# Altium footprint library ICs And Semiconductors THD.PcbLib: 350 footprints (part 10 of 22)
Each footprint in its own frame and in the unit in brackets; x right, y up, seen from the top. Pads: shape width x height; smd on the part's side, far side on the other; paste and mask are expansions set on the pad; w line width, h text height; cw(c..) or ccw(c..) is an arc to the next point about the centre after c.
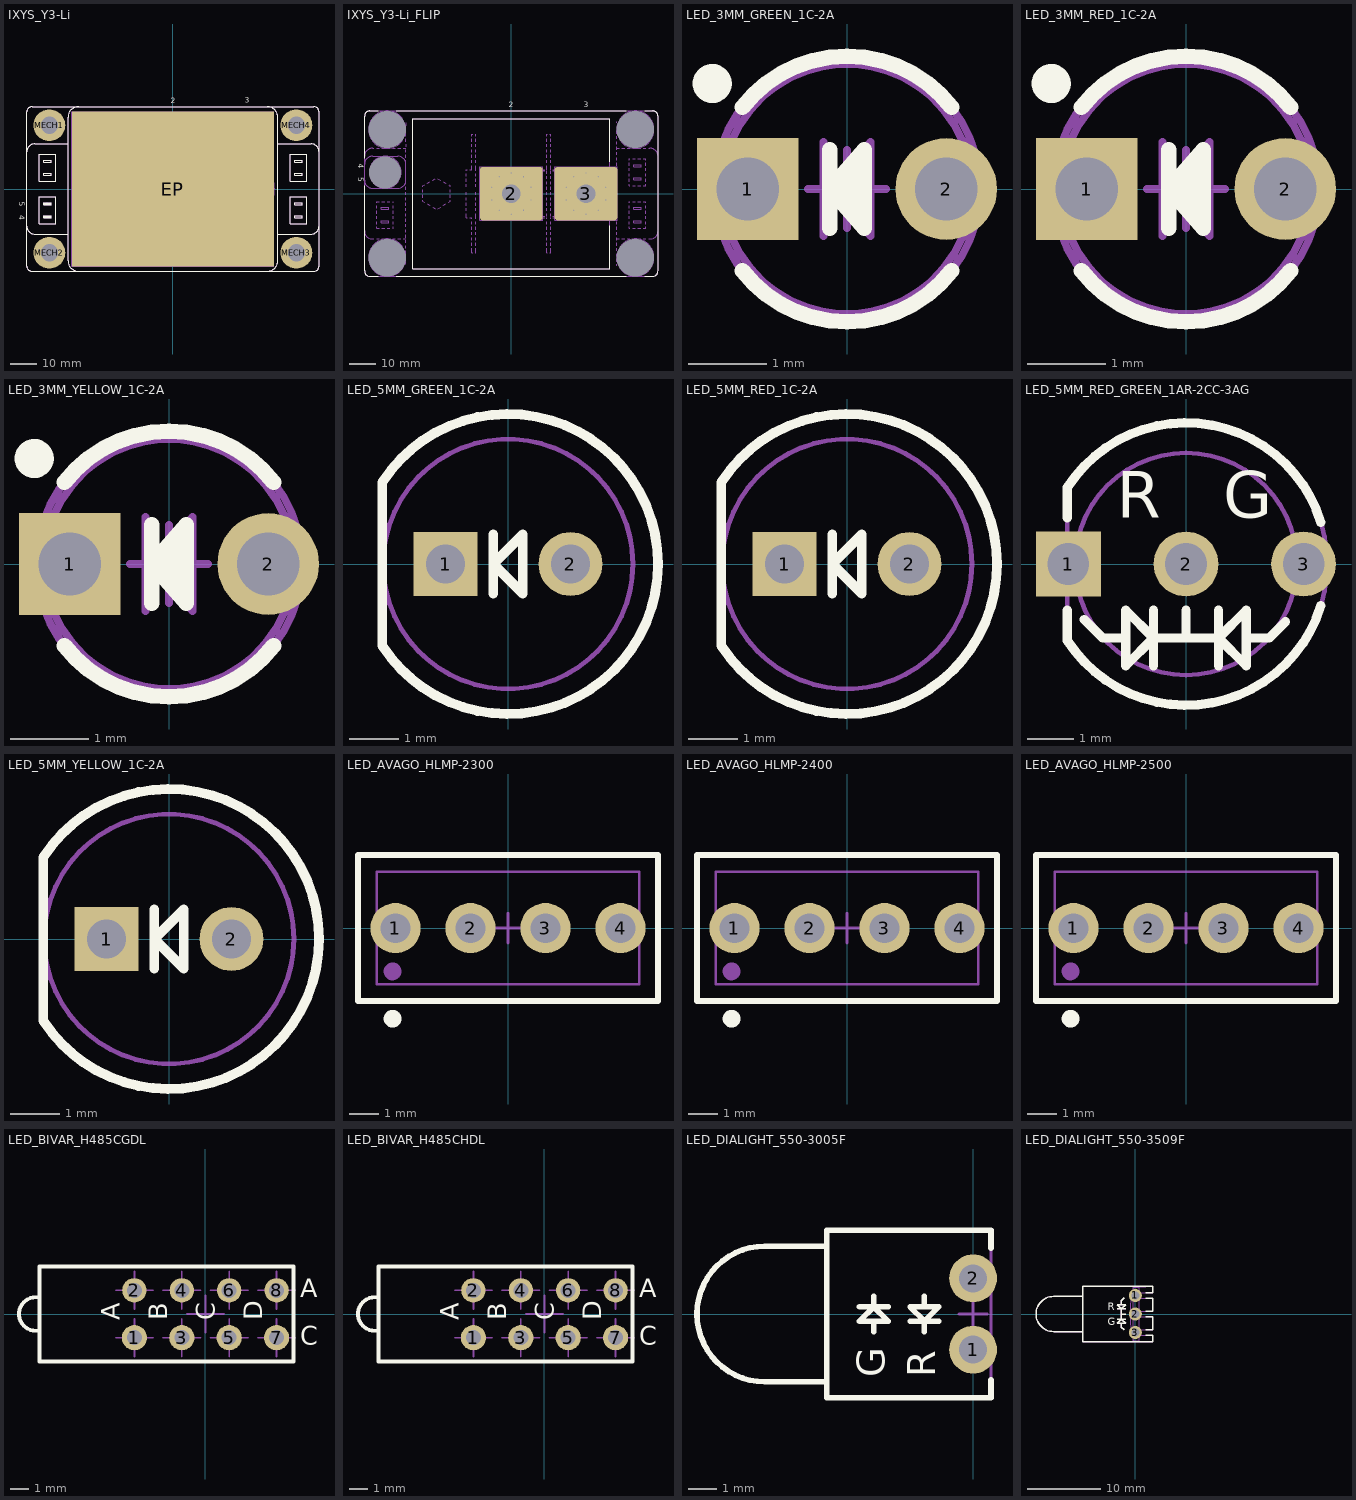
[diagram p9: the footprints below, top view; thin cyan lines are the x and y axes]

## IXYS_Y3-Li [mm] "IXYS Y3-Li Case, Body 110mm x 62mm, Screws on PCB Version"
height 31
pads (5):
  rect 76x58.2 smd: EP(0,0)
  round 12 hole 6.5: MECH1(-46.5,24) MECH2(-46.5,-24) MECH3(46.5,-24) MECH4(46.5,24)
Top Overlay:
  lines w0.2: -55,-14 ccw(c-52,-14) -52,-17 -39.5,-17 ; -55,14 cw(c-52,14) -52,17 -39.5,17 ; -48.65,-10.8 -45.85,-10.8 ; -48.65,-10.7 -45.85,-10.7 ; -48.65,-10.6 -45.85,-10.6 ; -48.65,-10.5 -45.85,-10.5 ; -48.65,-10.4 -45.85,-10.4 ; -48.65,-10.3 -45.85,-10.3 ; -48.65,-10.2 -45.85,-10.2 ; -48.65,-5.8 -45.85,-5.8 ; -48.65,-5.7 -45.85,-5.7 ; -48.65,-5.6 -45.85,-5.6 ; -48.65,-5.5 -45.85,-5.5 ; -48.65,-5.4 -45.85,-5.4 ; -48.65,-5.3 -45.85,-5.3 ; -48.65,-5.2 -45.85,-5.2 ; -35.5,-31 cw(c-35.5,-27) -39.5,-27 -39.5,27 cw(c-35.5,27) -35.5,31 ; 35.5,-31 ccw(c35.5,-27) 39.5,-27 39.5,27 ccw(c35.5,27) 35.5,31 ; 39.5,-17 52,-17 ccw(c52,-14) 55,-14 ; 39.5,17 52,17 cw(c52,14) 55,14 ; -55,-29 ccw(c-53,-29) -53,-31 53,-31 ccw(c53,-29) 55,-29 55,29 ccw(c53,29) 53,31 -53,31 ccw(c-53,29) -55,29 -55,-29 ; -50.35,-13 -50.35,-3 -44.15,-3 -44.15,-13 -50.35,-13 ; -50.35,3 -44.15,3 -44.15,13 -50.35,13 -50.35,3 ; -48.65,-10.9 -48.65,-10.1 -45.85,-10.1 -45.85,-10.9 -48.65,-10.9 ; -48.65,-5.9 -48.65,-5.1 -45.85,-5.1 -45.85,-5.9 -48.65,-5.9 ; -48.65,5.1 -48.65,5.9 -45.85,5.9 -45.85,5.1 -48.65,5.1 ; -48.65,10.1 -48.65,10.9 -45.85,10.9 -45.85,10.1 -48.65,10.1 ; 44.15,-13 50.35,-13 50.35,-3 44.15,-3 44.15,-13 ; 44.15,3 50.35,3 50.35,13 44.15,13 44.15,3 ; 45.85,-10.9 48.65,-10.9 48.65,-10.1 45.85,-10.1 45.85,-10.9 ; 45.85,-5.9 48.65,-5.9 48.65,-5.1 45.85,-5.1 45.85,-5.9 ; 45.85,5.1 48.65,5.1 48.65,5.9 45.85,5.9 45.85,5.1 ; 45.85,10.1 48.65,10.1 48.65,10.9 45.85,10.9 45.85,10.1
  text "4" at -57.95,-9.846 h2
  text "3" at 27.096,32.45 h2
  text "2" at -0.904,32.35 h2
  text "5" at -57.95,-4.846 h2
Notvisible:
  lines w0.1: -47.75,-10.5 -47.25,-10.5 ; -47.75,-5.5 -47.25,-5.5 ; -47.25,-11 -47.25,-10.5 ; -47.25,-10 -47.25,-10.5 ; -47.25,-6 -47.25,-5.5 ; -47.25,-5 -47.25,-5.5 ; -47,-24 -46.5,-24 ; -47,24 -46.5,24 ; -46.75,-10.5 -47.25,-10.5 ; -46.75,-5.5 -47.25,-5.5 ; -46.5,-24.5 -46.5,-24 ; -46.5,-23.5 -46.5,-24 ; -46.5,23.5 -46.5,24 ; -46.5,24.5 -46.5,24 ; -46,-24 -46.5,-24 ; -46,24 -46.5,24 ; -0.5,0 0,0 ; 0,-0.5 0,0 ; 0,0.5 0,0 ; 0.5,0 0,0 ; 27.5,0 28,0 ; 28,-0.5 28,0 ; 28,0.5 28,0 ; 28.5,0 28,0 ; 46,-24 46.5,-24 ; 46,24 46.5,24 ; 46.5,-24.5 46.5,-24 ; 46.5,-23.5 46.5,-24 ; 46.5,23.5 46.5,24 ; 46.5,24.5 46.5,24 ; 47,-24 46.5,-24 ; 47,24 46.5,24 ; -38,-29.1 -38,29.1 38,29.1 38,-29.1 -38,-29.1
Mechanical 14:
  circle w0.1: c-28,0 r3
  circle w0.1: c46.5,-24 r3.25
  circle w0.1: c46.5,24 r3.25
  circle w0.1: c-46.5,24 r3.25
  circle w0.1: c-46.5,-24 r3.288
  lines w0.1: -55,-14 ccw(c-52,-14) -52,-17 -39.5,-17 ; -55,14 cw(c-52,14) -52,17 -39.5,17 ; -48.65,-10.8 -45.85,-10.8 ; -48.65,-10.7 -45.85,-10.7 ; -48.65,-10.6 -45.85,-10.6 ; -48.65,-10.5 -45.85,-10.5 ; -48.65,-10.4 -45.85,-10.4 ; -48.65,-10.3 -45.85,-10.3 ; -48.65,-10.2 -45.85,-10.2 ; -48.65,-5.8 -45.85,-5.8 ; -48.65,-5.7 -45.85,-5.7 ; -48.65,-5.6 -45.85,-5.6 ; -48.65,-5.5 -45.85,-5.5 ; -48.65,-5.4 -45.85,-5.4 ; -48.65,-5.3 -45.85,-5.3 ; -48.65,-5.2 -45.85,-5.2 ; -35.5,-31 cw(c-35.5,-27) -39.5,-27 -39.5,27 cw(c-35.5,27) -35.5,31 ; 11.1,-8.5 11.1,-9 13.25,-9 13.25,-22.25 14.75,-22.25 14.75,-9 16.9,-9 16.9,-8.5 ; 11.1,8.5 11.1,9 13.25,9 13.25,22.25 14.75,22.25 14.75,9 16.9,9 16.9,8.5 ; 35.5,-31 ccw(c35.5,-27) 39.5,-27 39.5,27 ccw(c35.5,27) 35.5,31 ; 39.5,-17 52,-17 ccw(c52,-14) 55,-14 ; 39.5,17 52,17 cw(c52,14) 55,14 ; -55,-29 ccw(c-53,-29) -53,-31 53,-31 ccw(c53,-29) 55,-29 55,29 ccw(c53,29) 53,31 -53,31 ccw(c-53,29) -55,29 -55,-29 ; -50.35,-13 -50.35,-3 -44.15,-3 -44.15,-13 -50.35,-13 ; -50.35,3 -44.15,3 -44.15,13 -50.35,13 -50.35,3 ; -48.65,-10.9 -48.65,-10.1 -45.85,-10.1 -45.85,-10.9 -48.65,-10.9 ; -48.65,-5.9 -48.65,-5.1 -45.85,-5.1 -45.85,-5.9 -48.65,-5.9 ; -48.65,5.1 -48.65,5.9 -45.85,5.9 -45.85,5.1 -48.65,5.1 ; -48.65,10.1 -48.65,10.9 -45.85,10.9 -45.85,10.1 -48.65,10.1 ; -33.1,-2.944 -33.1,2.944 -28,5.889 -22.9,2.944 -22.9,-2.944 -28,-5.889 -33.1,-2.944 ; -16.9,-9 -14.75,-9 -14.75,-22.25 -13.25,-22.25 -13.25,22.25 -14.75,22.25 -14.75,9 -16.9,9 -16.9,-9 ; -8.25,-8.5 cw(c8.813,0) -8.25,8.5 13.25,8.5 13.25,-8.5 -8.25,-8.5 ; -0.5,-3.25 cw(c-0.5,0) -0.5,3.25 0.5,3.25 cw(c0.5,0) 0.5,-3.25 -0.5,-3.25 ; 14.75,-8.5 14.75,8.5 36.25,8.5 cw(c19.188,0) 36.25,-8.5 14.75,-8.5 ; 27.5,-3.25 cw(c27.5,0) 27.5,3.25 28.5,3.25 cw(c28.5,0) 28.5,-3.25 27.5,-3.25 ; 44.15,-13 50.35,-13 50.35,-3 44.15,-3 44.15,-13 ; 44.15,3 50.35,3 50.35,13 44.15,13 44.15,3 ; 45.85,-10.9 48.65,-10.9 48.65,-10.1 45.85,-10.1 45.85,-10.9 ; 45.85,-5.9 48.65,-5.9 48.65,-5.1 45.85,-5.1 45.85,-5.9 ; 45.85,5.1 48.65,5.1 48.65,5.9 45.85,5.9 45.85,5.1 ; 45.85,10.1 48.65,10.1 48.65,10.9 45.85,10.9 45.85,10.1
  text "4" at -57.95,-9.846 h2
  text "5" at -57.95,-4.846 h2
3D body "IXYS_Y3-Li.stp": height 31, standoff 0, extent -55,-31 55,31

## IXYS_Y3-Li_FLIP [mm] "IXYS Y3-Li Case, Body 110mm x 62mm"
height 31
pads (7):
  rrect10% 23.5x20 hole 7: 2(0,0) 3(28,0)
  round 1 hole 14 unplated mask+6.5: MECH1(-46.5,24) MECH2(-46.5,-24) MECH3(46.5,-24) MECH4(46.5,24)
  round 1 hole 12 unplated mask+5.5: MECH5(-47.25,8)
via 4.555,6.27 diameter 1 hole 0.5
via 7.371,2.395 diameter 1 hole 0.5
via 7.371,-2.395 diameter 1 hole 0.5
via 4.555,-6.27 diameter 1 hole 0.5
via -4.555,-6.27 diameter 1 hole 0.5
via -7.371,-2.395 diameter 1 hole 0.5
via -7.371,2.395 diameter 1 hole 0.5
via -4.555,6.27 diameter 1 hole 0.5
via 0,7.75 diameter 1 hole 0.5
via 0,-7.75 diameter 1 hole 0.5
via 23.445,6.27 diameter 1 hole 0.5
via 28,7.75 diameter 1 hole 0.5
via 32.555,6.27 diameter 1 hole 0.5
via 35.371,2.395 diameter 1 hole 0.5
via 35.371,-2.395 diameter 1 hole 0.5
via 32.555,-6.27 diameter 1 hole 0.5
via 28,-7.75 diameter 1 hole 0.5
via 23.445,-6.27 diameter 1 hole 0.5
via 20.629,-2.395 diameter 1 hole 0.5
via 20.629,2.395 diameter 1 hole 0.5
Top Overlay:
  lines w0.2: -55,3 -55,-29 ccw(c-53,-29) -53,-31 -49.941,-31 ; -55,13.332 -55,29 cw(c-53,29) -53,31 -49.941,31 ; -43.059,-31 43.059,-31 ; -43.059,31 43.059,31 ; 37,-12 37,-28.1 -37,-28.1 -37,28.1 37,28.1 37,12 ; 49.941,-31 53,-31 ccw(c53,-29) 55,-29 55,29 ccw(c53,29) 53,31 49.941,31
  text "2" at -0.904,32.35 h2
  text "3" at 27.096,32.45 h2
  text "4" at -57.45,11.154 h2
  text "5" at -57.45,6.154 h2
Notvisible:
  circle w0.1: c-46.5,24 r7
  circle w0.1: c-47.25,8 r6
  circle w0.1: c46.5,-24 r7
  circle w0.1: c-46.5,-24 r7
  circle w0.1: c46.5,24 r7
  circle w0.1: c28,0 r7.75
  circle w0.1: c0,0 r7.75
  circle w0.1: c28,0 r3.5
  circle w0.1: c0,0 r3.5
  lines w0.1: -47.75,5.5 -47.25,5.5 ; -47.75,8 -47.25,8 ; -47.75,10.5 -47.25,10.5 ; -47.25,5 -47.25,5.5 ; -47.25,6 -47.25,5.5 ; -47.25,7.5 -47.25,8 ; -47.25,8.5 -47.25,8 ; -47.25,10 -47.25,10.5 ; -47.25,11 -47.25,10.5 ; -47,-24 -46.5,-24 ; -47,24 -46.5,24 ; -46.75,5.5 -47.25,5.5 ; -46.75,8 -47.25,8 ; -46.75,10.5 -47.25,10.5 ; -46.5,-24.5 -46.5,-24 ; -46.5,-23.5 -46.5,-24 ; -46.5,23.5 -46.5,24 ; -46.5,24.5 -46.5,24 ; -46,-24 -46.5,-24 ; -46,24 -46.5,24 ; -39.5,4.5 -39.5,11 ccw(c-42.5,11) -42.5,14 -52,14 ccw(c-52,11) -55,11 -55,5 ccw(c-52,5) -52,2 -42.5,2 ccw(c-42.5,5) -39.5,5 ; -7.371,-2.395 0,0 ; -7.371,2.395 0,0 ; -4.555,-6.27 0,0 ; -4.555,6.27 0,0 ; -0.354,-0.354 0,0 ; -0.354,0.354 0,0 ; 0,-7.75 0,0 ; 0,7.75 0,0 ; 0.354,-0.354 0,0 ; 0.354,0.354 0,0 ; 4.555,-6.27 0,0 ; 4.555,6.27 0,0 ; 7.371,-2.395 0,0 ; 7.371,2.395 0,0 ; 20.629,-2.395 28,0 ; 20.629,2.395 28,0 ; 23.445,-6.27 28,0 ; 23.445,6.27 28,0 ; 27.646,-0.354 28,0 ; 27.646,0.354 28,0 ; 28,-7.75 28,0 ; 28,7.75 28,0 ; 28.354,-0.354 28,0 ; 28.354,0.354 28,0 ; 32.555,-6.27 28,0 ; 32.555,6.27 28,0 ; 35.371,-2.395 28,0 ; 35.371,2.395 28,0 ; 46,-24 46.5,-24 ; 46,24 46.5,24 ; 46.5,-24.5 46.5,-24 ; 46.5,-23.5 46.5,-24 ; 46.5,23.5 46.5,24 ; 46.5,24.5 46.5,24 ; 47,-24 46.5,-24 ; 47,24 46.5,24 ; -11.75,-10 11.75,-10 11.75,10 -11.75,10 -11.75,-10 ; 16.25,-10 16.25,10 39.75,10 39.75,-10 16.25,-10
Mechanical 14:
  drawing of 385 lines, arcs and shapes, not listed
  text "4" at -57.45,11.154 h2
  text "5" at -57.45,6.154 h2
3D body "IXYS_Y3-Li_FLIP.stp": height 31, standoff 0, extent -55,-31 55,31

## LED_3MM_GREEN_1C-2A [mm] "LED, Green, Body Dia. 3.43 mm, Pin spacing 2.54mm"
height 6.35
pads (2):
  rect 1.3x1.3 hole 0.8: 1(-1.27,0)
  round 1.3 hole 0.8: 2(1.27,0)
Top Overlay:
  circle w0.25: c-1.725,1.35 r0.125
  lines w0.2: -1.339,-1.048 ccw(c0,0) 1.339,-1.048 ; -1.339,1.048 cw(c0,0) 1.339,1.048 ; -0.22,-0.5 -0.22,0.5 ; 0.22,-0.4 -0.22,0 ; 0.22,-0.3 -0.22,0 ; 0.22,-0.2 -0.22,0 ; 0.22,-0.1 -0.22,0 ; 0.22,0 -0.22,0 ; 0.22,0.1 -0.22,0 ; 0.22,0.2 -0.22,0 ; 0.22,0.3 -0.22,0 ; 0.22,0.4 -0.22,0 ; -0.22,0 0.22,0.5 0.22,-0.5 -0.22,0
Notvisible:
  lines w0.1: -1.77,0 -1.27,0 ; -1.27,-0.5 -1.27,0 ; -1.27,0.5 -1.27,0 ; -0.77,0 -1.27,0 ; -0.5,0 0,0 ; 0,-0.5 0,0 ; 0,0.5 0,0 ; 0.5,0 0,0 ; 0.77,0 1.27,0 ; 1.27,-0.5 1.27,0 ; 1.27,0.5 1.27,0 ; 1.77,0 1.27,0
Mechanical 14:
  circle w0.1: c0,0 r1.7
  circle w0.1: c0,0 r1.6
  lines w0.1: -0.3,-0.6 -0.3,0.6 ; 0.3,0 -0.3,0 ; -0.3,0 0.3,0.6 0.3,-0.6 -0.3,0
3D body "LED_3MM_GREEN_v.stp": height 9.85, standoff -3.5, extent -1.715,-1.715 1.715,1.715

## LED_3MM_RED_1C-2A [mm] "LED, Red, Body Dia. 3.43 mm, Pin spacing 2.54mm"
height 6.35
pads (2):
  rect 1.3x1.3 hole 0.8: 1(-1.27,0)
  round 1.3 hole 0.8: 2(1.27,0)
Top Overlay:
  circle w0.25: c-1.725,1.35 r0.125
  lines w0.2: -1.339,-1.048 ccw(c0,0) 1.339,-1.048 ; -1.339,1.048 cw(c0,0) 1.339,1.048 ; -0.22,-0.5 -0.22,0.5 ; 0.22,-0.4 -0.22,0 ; 0.22,-0.3 -0.22,0 ; 0.22,-0.2 -0.22,0 ; 0.22,-0.1 -0.22,0 ; 0.22,0 -0.22,0 ; 0.22,0.1 -0.22,0 ; 0.22,0.2 -0.22,0 ; 0.22,0.3 -0.22,0 ; 0.22,0.4 -0.22,0 ; -0.22,0 0.22,0.5 0.22,-0.5 -0.22,0
Notvisible:
  lines w0.1: -1.77,0 -1.27,0 ; -1.27,-0.5 -1.27,0 ; -1.27,0.5 -1.27,0 ; -0.77,0 -1.27,0 ; -0.5,0 0,0 ; 0,-0.5 0,0 ; 0,0.5 0,0 ; 0.5,0 0,0 ; 0.77,0 1.27,0 ; 1.27,-0.5 1.27,0 ; 1.27,0.5 1.27,0 ; 1.77,0 1.27,0
Mechanical 14:
  circle w0.1: c0,0 r1.7
  circle w0.1: c0,0 r1.6
  lines w0.1: -0.3,-0.6 -0.3,0.6 ; 0.3,0 -0.3,0 ; -0.3,0 0.3,0.6 0.3,-0.6 -0.3,0
3D body "LED_3MM_RED_v.stp": height 9.85, standoff -3.5, extent -1.715,-1.715 1.715,1.715

## LED_3MM_YELLOW_1C-2A [mm] "LED, Red, Body Dia. 3.43 mm, Pin spacing 2.54mm"
height 6.35
pads (2):
  rect 1.3x1.3 hole 0.8: 1(-1.27,0)
  round 1.3 hole 0.8: 2(1.27,0)
Top Overlay:
  circle w0.25: c-1.725,1.35 r0.125
  lines w0.2: -1.339,-1.048 ccw(c0,0) 1.339,-1.048 ; -1.339,1.048 cw(c0,0) 1.339,1.048 ; -0.22,-0.5 -0.22,0.5 ; 0.22,-0.4 -0.22,0 ; 0.22,-0.3 -0.22,0 ; 0.22,-0.2 -0.22,0 ; 0.22,-0.1 -0.22,0 ; 0.22,0 -0.22,0 ; 0.22,0.1 -0.22,0 ; 0.22,0.2 -0.22,0 ; 0.22,0.3 -0.22,0 ; 0.22,0.4 -0.22,0 ; -0.22,0 0.22,-0.5 0.22,0.5 -0.22,0
Notvisible:
  lines w0.1: -1.77,0 -1.27,0 ; -1.27,-0.5 -1.27,0 ; -1.27,0.5 -1.27,0 ; -0.77,0 -1.27,0 ; -0.5,0 0,0 ; 0,-0.5 0,0 ; 0,0.5 0,0 ; 0.5,0 0,0 ; 0.77,0 1.27,0 ; 1.27,-0.5 1.27,0 ; 1.27,0.5 1.27,0 ; 1.77,0 1.27,0
Mechanical 14:
  circle w0.1: c0,0 r1.6
  circle w0.1: c0,0 r1.7
  lines w0.1: -0.3,-0.6 -0.3,0.6 ; 0.3,0 -0.3,0 ; -0.3,0 0.3,-0.6 0.3,0.6 -0.3,0
3D body "LED_3MM_YELLOW_v.stp": height 9.85, standoff -3.5, extent -1.715,-1.715 1.715,1.715

## LED_5MM_GREEN_1C-2A [mm] "LED, Green, Body Dia. 5.08mm, Pin spacing 2.54mm"
height 9.19
pads (2):
  rect 1.3x1.3 hole 0.8: 1(-1.27,0)
  round 1.3 hole 0.8: 2(1.27,0)
Top Overlay:
  lines w0.2: -0.3,-0.6 -0.3,0.6 ; -2.558,-1.661 ccw(c0,0) -2.558,1.661 -2.558,-1.661 ; -0.3,0 0.3,0.6 0.3,-0.6 -0.3,0
Mechanical 14:
  circle w0.1: c0,0 r2.54
  lines w0.1: -0.3,-0.6 -0.3,0.6 ; -2.529,-1.706 ccw(c0,0) -2.529,1.706 -2.529,-1.706 ; -0.3,0 0.3,-0.6 0.3,0.6 -0.3,0
3D body "LED_5MM_GREEN_v.stp": height 14.32, standoff -3.5, extent -2.54,-3.048 3.05,3.048

## LED_5MM_RED_1C-2A [mm] "LED, Red, Body Dia. 5.08mm, Pin spacing 2.54mm"
height 9.19
pads (2):
  rect 1.3x1.3 hole 0.8: 1(-1.27,0)
  round 1.3 hole 0.8: 2(1.27,0)
Top Overlay:
  lines w0.2: -0.3,-0.6 -0.3,0.6 ; -2.558,-1.661 ccw(c0,0) -2.558,1.661 -2.558,-1.661 ; -0.3,0 0.3,-0.6 0.3,0.6 -0.3,0
Mechanical 14:
  circle w0.1: c0,0 r2.54
  lines w0.1: -0.3,-0.6 -0.3,0.6 ; -2.529,-1.706 ccw(c0,0) -2.529,1.706 -2.529,-1.706 ; -0.3,0 0.3,0.6 0.3,-0.6 -0.3,0
3D body "LED_5MM_RED_v.stp": height 14.32, standoff -3.5, extent -2.54,-3.048 3.05,3.048

## LED_5MM_RED_GREEN_1AR-2CC-3AG [mm] "Bicolor Red/Green  LED 1 Anode Red 2 Com Cathode 3 Anode Green, Body Dia. 5.08mm, Pin spacing 2.54mm"
height 12.4
pads (3):
  rect 1.4x1.4 hole 0.9: 1(-2.54,0)
  round 1.4 hole 0.9: 2(0,0) 3(2.54,0)
Top Overlay:
  lines w0.2: -2.563,-1 -2.563,-1.653 ccw(c0,0) 2.913,-0.904 ; -2.563,1 -2.563,1.653 cw(c0,0) 2.913,0.904 ; -2.2,-1.2 -1.8,-1.6 -1.3,-1.6 ; -0.7,-2.2 -0.7,-1 ; 0,-1.6 0,-1 ; 0.7,-2.2 0.7,-1 ; 1.3,-1.6 1.8,-1.6 2.15,-1.25 ; -0.7,-1.6 -1.3,-2.2 -1.3,-1 -0.7,-1.6 ; -0.7,-1.6 0.7,-1.6 ; 0.7,-1.6 1.3,-1 1.3,-2.2 0.7,-1.6
  text "R" at -1.5,1 h1
  text "G" at 0.8,1 h1
Mechanical 14:
  lines w0.1: -1.8,-1.6 -1.3,-1.6 ; -0.7,-2.2 -0.7,-1 ; 0,-1.6 0,-1 ; 0.7,-2.2 0.7,-1 ; 1.3,-1.6 1.8,-1.6 ; -0.7,-1.6 0.7,-1.6 ; -0.7,-1.6 -1.3,-1 -1.3,-2.2 -0.7,-1.6 ; 0.7,-1.6 1.3,-2.2 1.3,-1 0.7,-1.6 ; -2.563,-1.653 ccw(c0,0) 3.05,0 ccw(c0,0) -2.563,1.653 -2.563,0 -2.563,-1.653 ; -2.4,0 cw(c0,0) 2.4,0 cw(c0,0) -2.4,0
3D body "LED_OSRAM_LU5351-JM-1.stp": height 12.4, standoff -3.6, extent -2.94,-2.95 2.95,2.95

## LED_5MM_YELLOW_1C-2A [mm] "LED, Yellow, Body Dia. 5.08mm, Pin spacing 2.54mm"
height 9.19
pads (2):
  rect 1.3x1.3 hole 0.8: 1(-1.27,0)
  round 1.3 hole 0.8: 2(1.27,0)
Top Overlay:
  lines w0.2: -0.3,-0.6 -0.3,0.6 ; -2.558,-1.661 ccw(c0,0) -2.558,1.661 -2.558,-1.661 ; -0.3,0 0.3,0.6 0.3,-0.6 -0.3,0
Mechanical 14:
  circle w0.1: c0,0 r2.54
  lines w0.1: -0.3,-0.6 -0.3,0.6 ; -2.529,-1.706 ccw(c0,0) -2.529,1.706 -2.529,-1.706 ; -0.3,0 0.3,0.6 0.3,-0.6 -0.3,0
3D body "LED_5MM_YELLOW_v.stp": height 14.32, standoff -3.5, extent -2.54,-3.048 3.05,3.048

## LED_AVAGO_HLMP-2300 [mm] "10.16x 4.953mm HER LED Bar Module (2 LEDs)"
height 6.22
pads (4):
  round 1.7 hole 1: 1(-3.81,0) 2(-1.27,0) 3(1.27,0) 4(3.81,0)
Top Overlay:
  circle w0.3: c-3.91,-3.07 r0.15
  lines w0.2: -5.08,-2.477 5.08,-2.477 5.08,2.477 -5.08,2.477 -5.08,-2.477
Notvisible:
  lines w0.1: -4.31,0 -3.81,0 ; -3.81,-0.5 -3.81,0 ; -3.81,0.5 -3.81,0 ; -3.31,0 -3.81,0 ; -1.77,0 -1.27,0 ; -1.27,-0.5 -1.27,0 ; -1.27,0.5 -1.27,0 ; -0.77,0 -1.27,0 ; -0.5,0 0,0 ; 0,-0.5 0,0 ; 0,0.5 0,0 ; 0.5,0 0,0 ; 0.77,0 1.27,0 ; 1.27,-0.5 1.27,0 ; 1.27,0.5 1.27,0 ; 1.77,0 1.27,0 ; 3.31,0 3.81,0 ; 3.81,-0.5 3.81,0 ; 3.81,0.5 3.81,0 ; 4.31,0 3.81,0
Mechanical 14:
  circle w0.3: c-3.91,-1.47 r0.15
  lines w0.1: -4.445,-1.905 4.445,-1.905 ; -4.445,-1.905 -4.445,1.905 ; -4.445,-1.905 4.445,-1.905 ; -4.445,-1.905 -4.445,1.905 ; -4.445,1.905 4.445,1.905 ; -4.445,1.905 4.445,1.905 ; 4.445,-1.905 4.445,1.905 ; 4.445,-1.905 4.445,1.905 ; -5.08,-2.477 5.08,-2.477 5.08,2.477 -5.08,2.477 -5.08,-2.477
3D body "LED_AVAGO_HLMP-2300.stp": height 6.22, standoff -3.18, extent -5.08,-2.476 5.08,2.477

## LED_AVAGO_HLMP-2400 [mm] "10.16x 4.953mm Yellow LED Bar Module (2 LEDs)"
height 6.22
pads (4):
  round 1.7 hole 1: 1(-3.81,0) 2(-1.27,0) 3(1.27,0) 4(3.81,0)
Top Overlay:
  circle w0.3: c-3.91,-3.07 r0.15
  lines w0.2: -5.08,-2.477 5.08,-2.477 5.08,2.477 -5.08,2.477 -5.08,-2.477
Notvisible:
  lines w0.1: -4.31,0 -3.81,0 ; -3.81,-0.5 -3.81,0 ; -3.81,0.5 -3.81,0 ; -3.31,0 -3.81,0 ; -1.77,0 -1.27,0 ; -1.27,-0.5 -1.27,0 ; -1.27,0.5 -1.27,0 ; -0.77,0 -1.27,0 ; -0.5,0 0,0 ; 0,-0.5 0,0 ; 0,0.5 0,0 ; 0.5,0 0,0 ; 0.77,0 1.27,0 ; 1.27,-0.5 1.27,0 ; 1.27,0.5 1.27,0 ; 1.77,0 1.27,0 ; 3.31,0 3.81,0 ; 3.81,-0.5 3.81,0 ; 3.81,0.5 3.81,0 ; 4.31,0 3.81,0
Mechanical 14:
  circle w0.3: c-3.91,-1.47 r0.15
  lines w0.1: -4.445,-1.905 4.445,-1.905 ; -4.445,-1.905 -4.445,1.905 ; -4.445,-1.905 4.445,-1.905 ; -4.445,-1.905 -4.445,1.905 ; -4.445,1.905 4.445,1.905 ; -4.445,1.905 4.445,1.905 ; 4.445,-1.905 4.445,1.905 ; 4.445,-1.905 4.445,1.905 ; -5.08,-2.477 5.08,-2.477 5.08,2.477 -5.08,2.477 -5.08,-2.477
3D body "LED_AVAGO_HLMP-2400.stp": height 6.22, standoff -3.18, extent -5.08,-2.476 5.08,2.477

## LED_AVAGO_HLMP-2500 [mm] "10.16x 4.953mm Green LED Bar Module (2 LEDs)"
height 6.22
pads (4):
  round 1.7 hole 1: 1(-3.81,0) 2(-1.27,0) 3(1.27,0) 4(3.81,0)
Top Overlay:
  circle w0.3: c-3.91,-3.07 r0.15
  lines w0.2: -5.08,-2.477 -5.08,2.477 5.08,2.477 5.08,-2.477 -5.08,-2.477
Notvisible:
  lines w0.1: -4.31,0 -3.81,0 ; -3.81,-0.5 -3.81,0 ; -3.81,0.5 -3.81,0 ; -3.31,0 -3.81,0 ; -1.77,0 -1.27,0 ; -1.27,-0.5 -1.27,0 ; -1.27,0.5 -1.27,0 ; -0.77,0 -1.27,0 ; -0.5,0 0,0 ; 0,-0.5 0,0 ; 0,0.5 0,0 ; 0.5,0 0,0 ; 0.77,0 1.27,0 ; 1.27,-0.5 1.27,0 ; 1.27,0.5 1.27,0 ; 1.77,0 1.27,0 ; 3.31,0 3.81,0 ; 3.81,-0.5 3.81,0 ; 3.81,0.5 3.81,0 ; 4.31,0 3.81,0
Mechanical 14:
  circle w0.3: c-3.91,-1.47 r0.15
  lines w0.1: -4.445,-1.905 -4.445,1.905 ; -4.445,-1.905 4.445,-1.905 ; -4.445,-1.905 -4.445,1.905 ; -4.445,-1.905 4.445,-1.905 ; -4.445,1.905 4.445,1.905 ; -4.445,1.905 4.445,1.905 ; 4.445,-1.905 4.445,1.905 ; 4.445,-1.905 4.445,1.905 ; -5.08,-2.477 -5.08,2.477 5.08,2.477 5.08,-2.477 -5.08,-2.477
3D body "LED_AVAGO_HLMP-2500.stp": height 6.22, standoff -3.18, extent -5.08,-2.476 5.08,2.477

## LED_BIVAR_H485CGDL [mm] "Quad-Level 2mm Green, PCB Edge Mounting  BIVAR H485CGDL"
height 11.3
pads (8):
  round 1.35 hole 0.8: 1(-3.81,-1.27) 3(-1.27,-1.27) 5(1.27,-1.27) 7(3.81,-1.27)
  round 1.3 hole 0.8: 2(-3.81,1.27) 4(-1.27,1.27) 6(1.27,1.27) 8(3.81,1.27)
Top Overlay:
  lines w0.2: -8.89,-0.9 -9.09,-0.9 cw(c-9.09,0) -9.09,0.9 -8.89,0.9 ; -8.89,-2.55 4.71,-2.55 4.71,2.55 -8.89,2.55 -8.89,-2.55
  text "C" at 5.08,-1.651 h1
  text "A" at 5.08,0.889 h1
  text "A" at -4.591,-0.331 h1
  text "B" at -2.051,-0.331 h1
  text "C" at 0.489,-0.331 h1
  text "D" at 3.029,-0.331 h1
Notvisible:
  lines w0.1: -4.81,-1.27 -3.81,-1.27 ; -4.81,1.27 -3.81,1.27 ; -3.81,-2.27 -3.81,-1.27 ; -3.81,-0.27 -3.81,-1.27 ; -3.81,0.27 -3.81,1.27 ; -3.81,2.27 -3.81,1.27 ; -2.81,-1.27 -3.81,-1.27 ; -2.81,1.27 -3.81,1.27 ; -2.27,-1.27 -1.27,-1.27 ; -2.27,1.27 -1.27,1.27 ; -1.27,-2.27 -1.27,-1.27 ; -1.27,-0.27 -1.27,-1.27 ; -1.27,0.27 -1.27,1.27 ; -1.27,2.27 -1.27,1.27 ; -1,0 0,0 ; -0.27,-1.27 -1.27,-1.27 ; -0.27,1.27 -1.27,1.27 ; 0,-1 0,0 ; 0,1 0,0 ; 0.27,-1.27 1.27,-1.27 ; 0.27,1.27 1.27,1.27 ; 1,0 0,0 ; 1.27,-2.27 1.27,-1.27 ; 1.27,-0.27 1.27,-1.27 ; 1.27,0.27 1.27,1.27 ; 1.27,2.27 1.27,1.27 ; 2.27,-1.27 1.27,-1.27 ; 2.27,1.27 1.27,1.27 ; 2.81,-1.27 3.81,-1.27 ; 2.81,1.27 3.81,1.27 ; 3.81,-2.27 3.81,-1.27 ; 3.81,-0.27 3.81,-1.27 ; 3.81,0.27 3.81,1.27 ; 3.81,2.27 3.81,1.27 ; 4.81,-1.27 3.81,-1.27 ; 4.81,1.27 3.81,1.27
Mechanical 14:
  lines w0.1: -8.89,-0.9 -9.09,-0.9 cw(c-9.09,0) -9.09,0.9 -8.89,0.9 ; -8.89,-2.55 4.71,-2.55 4.71,2.55 -8.89,2.55 -8.89,-2.55
  text "A" at 5.08,0.889 h1
  text "C" at 5.08,-1.651 h1
  text "A" at -4.591,-0.331 h1
  text "B" at -2.051,-0.331 h1
  text "C" at 0.489,-0.331 h1
  text "D" at 3.029,-0.331 h1
3D body "LED_BIVAR_H485CGDL.stp": height 11.3, standoff -3.2, extent -9.99,-2.55 4.71,2.55

## LED_BIVAR_H485CHDL [mm] "Quad-Level 2mm HE Red, PCB Edge Mounting  BIVAR H485CHDL"
height 11.3
pads (8):
  round 1.35 hole 0.8: 1(-3.81,-1.27) 3(-1.27,-1.27) 5(1.27,-1.27) 7(3.81,-1.27)
  round 1.3 hole 0.8: 2(-3.81,1.27) 4(-1.27,1.27) 6(1.27,1.27) 8(3.81,1.27)
Top Overlay:
  lines w0.2: -8.89,-0.9 -9.09,-0.9 cw(c-9.09,0) -9.09,0.9 -8.89,0.9 ; -8.89,-2.55 -8.89,2.55 4.71,2.55 4.71,-2.55 -8.89,-2.55
  text "A" at -4.591,-0.331 h1
  text "B" at -2.051,-0.331 h1
  text "C" at 0.489,-0.331 h1
  text "D" at 3.029,-0.331 h1
  text "A" at 5.08,0.889 h1
  text "C" at 5.08,-1.651 h1
Notvisible:
  lines w0.1: -4.81,-1.27 -3.81,-1.27 ; -4.81,1.27 -3.81,1.27 ; -3.81,-2.27 -3.81,-1.27 ; -3.81,-0.27 -3.81,-1.27 ; -3.81,0.27 -3.81,1.27 ; -3.81,2.27 -3.81,1.27 ; -2.81,-1.27 -3.81,-1.27 ; -2.81,1.27 -3.81,1.27 ; -2.27,-1.27 -1.27,-1.27 ; -2.27,1.27 -1.27,1.27 ; -1.27,-2.27 -1.27,-1.27 ; -1.27,-0.27 -1.27,-1.27 ; -1.27,0.27 -1.27,1.27 ; -1.27,2.27 -1.27,1.27 ; -1,0 0,0 ; -0.27,-1.27 -1.27,-1.27 ; -0.27,1.27 -1.27,1.27 ; 0,-1 0,0 ; 0,1 0,0 ; 0.27,-1.27 1.27,-1.27 ; 0.27,1.27 1.27,1.27 ; 1,0 0,0 ; 1.27,-2.27 1.27,-1.27 ; 1.27,-0.27 1.27,-1.27 ; 1.27,0.27 1.27,1.27 ; 1.27,2.27 1.27,1.27 ; 2.27,-1.27 1.27,-1.27 ; 2.27,1.27 1.27,1.27 ; 2.81,-1.27 3.81,-1.27 ; 2.81,1.27 3.81,1.27 ; 3.81,-2.27 3.81,-1.27 ; 3.81,-0.27 3.81,-1.27 ; 3.81,0.27 3.81,1.27 ; 3.81,2.27 3.81,1.27 ; 4.81,-1.27 3.81,-1.27 ; 4.81,1.27 3.81,1.27
Mechanical 14:
  lines w0.1: -8.89,-0.9 -9.09,-0.9 cw(c-9.09,0) -9.09,0.9 -8.89,0.9 ; -8.89,-2.55 -8.89,2.55 4.71,2.55 4.71,-2.55 -8.89,-2.55
  text "A" at -4.591,-0.331 h1
  text "B" at -2.051,-0.331 h1
  text "C" at 0.489,-0.331 h1
  text "D" at 3.029,-0.331 h1
  text "C" at 5.08,-1.651 h1
  text "A" at 5.08,0.889 h1
3D body "LED_BIVAR_H485CHDL.stp": height 11.3, standoff -3.2, extent -9.99,-2.55 4.71,2.55

## LED_DIALIGHT_550-3005F [mm] "Single 5mm Bi-color Red/Green LED, Body 5.84x6.1mm (Square Back Housing), Leads Spacing 2.54mm"
height 6.1
pads (2):
  round 1.7 hole 1: 1(0,-1.27) 2(0,1.27)
Top Overlay:
  lines w0.2: -5.207,-2.415 -7.411,-2.415 cw(c-7.411,0) -7.411,2.415 -5.207,2.415 ; -4.042,0.254 -3.026,0.254 ; -3.534,-0.635 -3.534,-0.254 ; -3.534,0.635 -3.534,0.254 ; -2.242,-0.254 -1.226,-0.254 ; -1.734,-0.635 -1.734,-0.254 ; -1.734,0.254 -1.734,0.635 ; 0.635,-2.347 0.635,-2.985 -5.207,-2.985 -5.207,2.985 0.635,2.985 0.635,2.347 ; -3.534,0.254 -4.042,-0.254 -3.026,-0.254 -3.534,0.254 ; -1.734,-0.254 -2.242,0.254 -1.226,0.254 -1.734,-0.254
  text "G" at -3.151,-2.256 h1
  text "R" at -1.351,-2.256 h1
Notvisible:
  lines w0.1: -0.5,-1.27 0,-1.27 ; -0.5,0 0,0 ; -0.5,1.27 0,1.27 ; 0,-1.77 0,-1.27 ; 0,-0.77 0,-1.27 ; 0,-0.5 0,0 ; 0,0.5 0,0 ; 0,0.77 0,1.27 ; 0,1.77 0,1.27 ; 0.5,-1.27 0,-1.27 ; 0.5,0 0,0 ; 0.5,1.27 0,1.27
Mechanical 14:
  lines w0.1: -5.207,-2.415 -7.411,-2.415 cw(c-7.411,0) -7.411,2.415 -5.207,2.415 ; -3.534,-0.635 -3.534,-0.254 ; -3.534,0.635 -3.534,0.254 ; -1.734,-0.635 -1.734,-0.254 ; -1.734,0.254 -1.734,0.635 ; -4.042,-0.254 -3.026,-0.254 ; -4.042,-0.254 -3.534,0.254 ; -4.042,-0.254 -3.534,0.254 ; -4.042,-0.254 -3.026,-0.254 ; -4.042,-0.254 -3.026,-0.254 ; -4.042,-0.254 -3.534,0.254 ; -4.042,0.254 -3.026,0.254 ; -4.042,0.254 -3.026,0.254 ; -4.042,0.254 -3.026,0.254 ; -3.534,0.254 -3.026,-0.254 ; -3.534,0.254 -3.026,-0.254 ; -3.534,0.254 -3.026,-0.254 ; -2.242,-0.254 -1.226,-0.254 ; -2.242,-0.254 -1.226,-0.254 ; -2.242,-0.254 -1.226,-0.254 ; -2.242,0.254 -1.734,-0.254 ; -2.242,0.254 -1.226,0.254 ; -2.242,0.254 -1.226,0.254 ; -2.242,0.254 -1.734,-0.254 ; -2.242,0.254 -1.734,-0.254 ; -2.242,0.254 -1.226,0.254 ; -1.734,-0.254 -1.226,0.254 ; -1.734,-0.254 -1.226,0.254 ; -1.734,-0.254 -1.226,0.254 ; -5.207,-2.985 -5.207,2.985 0.635,2.985 0.635,1.714 0.44,1.714 0.44,0.826 0.635,0.826 0.635,-0.826 0.44,-0.826 0.44,-1.714 0.635,-1.714 0.635,-2.985 -5.207,-2.985
  text "G" at -3.151,-2.256 h1
  text "R" at -1.351,-2.256 h1
3D body "LED_DIALIGHT_550-3005F.stp": height 5.97, standoff -3.67, extent -9.826,-2.984 0.635,2.985

## LED_DIALIGHT_550-3509F [mm] "Bicolor Red/Green  LED, 3-Leads, Body 9.65x7.62mm, Leads Spacing 2.54mm"
height 7.62
pads (3):
  round 1.8 hole 1.1: 1(0,2.54) 2(0,0) 3(0,-2.54)
Top Overlay:
  lines w0.2: -7.24,-2.415 -11.225,-2.415 cw(c-11.225,0) -11.225,2.415 -7.24,2.415 ; -2.505,-0.7 -1.305,-0.7 ; -2.505,0.7 -1.305,0.7 ; -1.905,-1.3 -1.905,-1.8 -1.555,-2.15 ; -1.905,0 -1.305,0 ; -1.905,1.3 -1.905,1.8 -1.505,2.2 ; 1.41,-2.921 2.41,-2.921 2.41,-3.81 -7.24,-3.81 -7.24,3.81 2.41,3.81 2.41,2.921 1.41,2.921 ; 1.41,-2.159 2.41,-2.159 2.41,-0.381 1.41,-0.381 ; 1.41,0.381 2.41,0.381 2.41,2.159 1.41,2.159 ; -1.905,-0.7 -1.305,-1.3 -2.505,-1.3 -1.905,-0.7 ; -1.905,-0.7 -1.905,0.7 ; -1.905,0.7 -2.505,1.3 -1.305,1.3 -1.905,0.7
  text "R" at -3.81,0.508 h1
  text "G" at -3.81,-1.524 h1
Notvisible:
  circle w0.1: c0,-2.54 r0.55
  circle w0.1: c0,0 r0.55
  circle w0.1: c0,2.54 r0.55
  lines w0.1: -0.5,-2.54 0,-2.54 ; -0.5,0 0,0 ; -0.5,2.54 0,2.54 ; 0,-3.04 0,-2.54 ; 0,-2.04 0,-2.54 ; 0,-0.5 0,0 ; 0,0.5 0,0 ; 0,2.04 0,2.54 ; 0,3.04 0,2.54 ; 0.5,-2.54 0,-2.54 ; 0.5,0 0,0 ; 0.5,2.54 0,2.54
Mechanical 14:
  lines w0.1: -7.24,-2.415 -11.225,-2.415 cw(c-11.225,0) -11.225,2.415 -7.24,2.415 ; -2.505,-0.7 -1.305,-0.7 ; -2.505,0.7 -1.305,0.7 ; -1.905,-1.8 -1.905,-1.3 ; -1.905,0 -1.305,0 ; -1.905,1.3 -1.905,1.8 ; -0.255,-2.921 2.41,-2.921 2.41,-3.81 ; -0.255,-0.381 2.41,-0.381 2.41,-2.159 -0.255,-2.159 -0.254,-2.286 0.254,-2.286 0.254,-2.794 -0.254,-2.794 ; -0.255,2.159 2.41,2.159 2.41,0.381 -0.255,0.381 -0.254,0.254 0.254,0.254 0.254,-0.254 -0.254,-0.254 ; -0.254,2.159 -0.254,2.286 0.254,2.286 0.254,2.794 -0.254,2.794 -0.255,2.921 2.41,2.921 2.41,3.81 ; 0.507,-2.921 0.507,-3.672 ; 0.507,-2.159 0.507,-0.381 ; 0.507,0.381 0.507,2.159 ; 0.507,2.921 0.507,3.672 ; -1.905,-0.7 -1.905,0.7 ; -1.905,-0.7 -2.505,-1.3 -1.305,-1.3 -1.905,-0.7 ; -1.905,0.7 -1.305,1.3 -2.505,1.3 -1.905,0.7 ; -0.255,-3.672 cw(c13.403,0) -0.255,3.672 ; -0.255,-3.672 -0.255,3.672 ; -0.255,-3.672 0.507,-3.672 ; -0.255,3.672 0.507,3.672 ; 0.507,-3.672 2.41,-3.81 ; 0.507,3.672 2.41,3.81 ; 2.41,-3.81 -7.24,-3.81 -7.24,3.81 2.41,3.81
  text "R" at -3.81,0.508 h1
  text "G" at -3.81,-1.524 h1
3D body "LED_DIALIGHT_550-3509F.stp": height 7.62, standoff -3.1, extent -13.64,-3.81 2.41,3.81